# Altium integrated library Twomes_Monitor_master.IntLib: 18 symbols
Pins are listed as number, name and electrical type; pins without a type are passive.

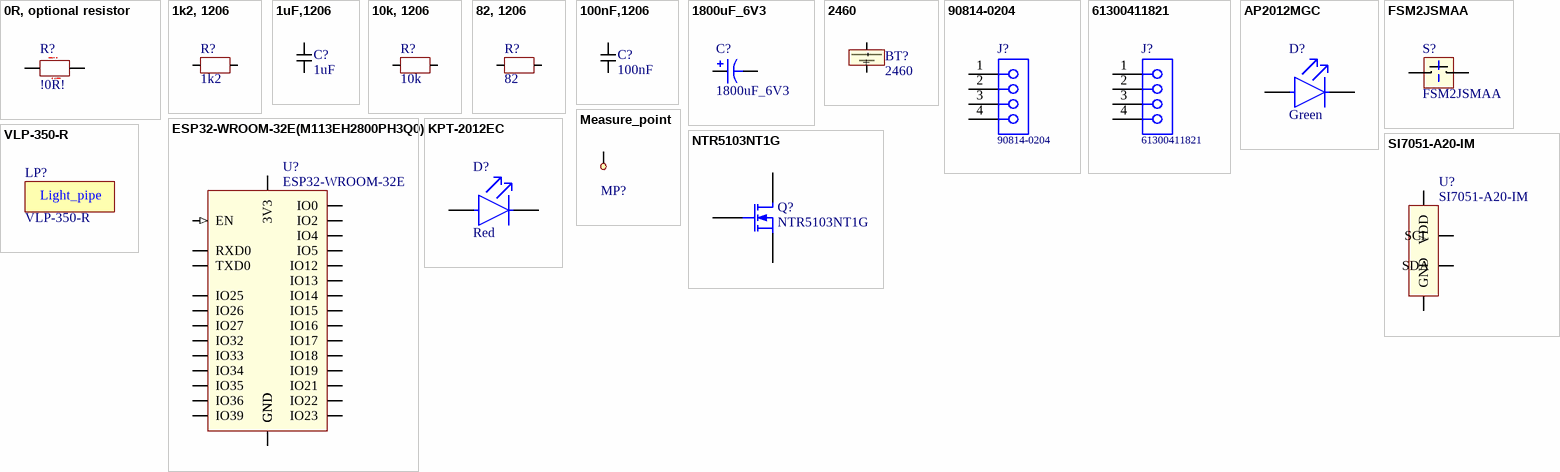
[diagram p0: symbols 0R, optional resistor to VLP-350-R]

## 0R, optional resistor
designator R?, comment !0R!  (no BOM)
normally shorted, but easy to change to an resistor footprint
footprint R1206_Simple-Assemble_shorted (Chip Resistor, 2-Leads, Body 3,10x1,60mm, IPC High Density)
footprint R1206_Simple-Assemble (Chip Resistor, 2-Leads, Body 3,10x1,60mm, IPC High Density)
pins: 1, 2
text: !

## 1k2, 1206
designator R?, comment 1k2
SMD Chip Resistor, 1206 [3216 Metric], 1 kohm, MCSR 12 Series, 200 V, Ceramic, 250 mW; Brand: MULTICOMP; Order Code: 2446791; Power: 250mW; Resistance: 1k2; Type: MCWR12X1201FTL; Supplier: Farnell; Price: 0,0298
footprint R1206_Simple-Assemble (Chip Resistor, 2-Leads, Body 3,10x1,60mm, IPC High Density)
footprint R1206 (Chip Resistor, 2-Leads, Body 3,10x1,57mm, IPC Medium Density)
pins: 1, 2

## 1uF,1206
designator C?, comment 1uF
1uF, 1206; Capacitance: 1uF; Brand: *; Order Code: *; Type: *
footprint C1206 (Chip Capacitor, 2-Leads, Body 3,20x1,60mm, IPC Medium Density)
pins: 1, 2

## 10k, 1206
designator R?, comment 10k
10k, 1206, 250mW, 200V; Brand: TE CONNECTIVITY; Order Code: 2861956; Resistance: 10k; Power: 250mW; Type: CRGCQ1206J10K; Supplier: Farnell; Price: 0,0139
footprint R1206_Simple-Assemble (Chip Resistor, 2-Leads, Body 3,10x1,60mm, IPC High Density)
footprint R1206 (Chip Resistor, 2-Leads, Body 3,10x1,57mm, IPC Medium Density)
pins: 1, 2

## 82, 1206
designator R?, comment 82
Brand: MULTICOMP; Resistance: 82; Supplier: Farnell
footprint R1206_Simple-Assemble (Chip Resistor, 2-Leads, Body 3,10x1,60mm, IPC High Density)
footprint R1206 (Chip Resistor, 2-Leads, Body 3,10x1,57mm, IPC Medium Density)
pins: 1, 2

## 100nF,1206
designator C?, comment 100nF
100nF, 1206; Capacitance: 100nF; Brand: *; Order Code: *; Type: *
footprint C1206 (Chip Capacitor, 2-Leads, Body 3,20x1,60mm, IPC Medium Density)
pins: 1, 2

## 1800uF_6V3
designator C?
SMD Aluminium Electrolytic Capacitor, Radial Can, 1800 µF, 10 V, 0.092 ohm, TRV Series; Manufacturer Part Number: EEE-FN0J182UV; Manufacturer: Panasonic; Capacitance: 1.8mF; Voltage Rating: 10V; Value: 1800uF; Supplier Unit Price 1: €0.98708; Supplier Part Number 1: 667-EEE-FN0J182UV; Supplier 1: Mouser; Mount: Surface Mount; Category: Aluminum Electrolytic Capacitors
footprint CAPAE109103X105M
pins: 1, 2

## 2460
designator BT?
Battery Holder, AA x 1, Through Hole; Brand: KEYSTONE; Farnell_Price: 1,80; Type: 2460; Farnell_Order_Code: 1702629; Mouser_Price: 1,10; Mouser_Order_Code: 534-2460
footprint KEYSTONE_2410 (Battery holder, AA)
pins: 1 +, 2 -

## 90814-0204
designator J?
Pin Header, Signal, 1.27 mm, 1 Rows, 4 Contacts, Surface Mount Straight, Picoflex 90814 Series; Manufacturer: MOLEX; Manufacturer Part Number: 90814-0204
footprint MOLEX_90814-0204
pins: 1, 2, 3, 4

## 61300411821
designator J?
THT Vertical Socket Header WR-PHD, Pitch 2.54 mm, Single Row, 4 pins; Pin Number: 4; Pitch: 2.54 mm; Gender: Female; Rated Current: 3 A; Working Voltage: 250 VAC; Withstanding Voltage: 500 VAC; Contact Resistance: 20 mOhm; ComponentLink1Description: Manufacturer; ComponentLink1URL: http://www.we-online.de; ComponentLink2Description: Datasheet; ComponentLink2URL: https://katalog.we-online.de/em/datasheet/6130xx11821.pdf; Part Number: 61300411821; Published Date: August 2018; Publisher: Wurth Elektronik; Operating Temperature: -40 to 125 degC; Mounting Technology: THT; Packaging: Tray; Row Number: Single; Orientation: Vertical
footprint 61300411821 (Socket Header, Pitch 2.54 mm, THT, Vertical, single row, 4p)
pins: 1, 2, 3, 4

## AP2012MGC
designator D?, comment Green
Standard LEDs - SMD GRN WATER CLEAR 0805; Manufacturer: Kingbright; Manufacturer Part Number: AP2012MGC; Forward Current: 20mA; Forward Voltage: 2.1V; Case/Package: 0805; Category: LEDs; Color: Green; Supplier 1: Mouser; Supplier Part Number 1: 604-AP2012MGC
footprint Kingbright_KPT-2012EC_0
pins: 1 C, 2 A

## ESP32-WROOM-32E(M113EH2800PH3Q0)
designator U?, comment ESP32-WROOM-32E
USB-modules (802.11) SMD Module ESP32-WROOM-32E, ESP32-D0WD-V3, 16 MB SPI flash, PCB antenna; Brand: Espressif Systems; Order Code: 356-ESP32WRM32E128PH; Type: ESP32-WROOM-32E; Price: 2,64; Supplier: MOUSER
footprint ESP32­WROOM­32E
pins: 1 GND (power) "Ground", 2 3V3 (power) "Power supply", 3 EN (in) "HIGH: on, LOW: off", 4 IO36 (io) "GPIO36, ADC1_CH0, RTC_GPIO0", 5 IO39 (io) "GPIO39, ADC1_CH3, RTC_GPIO3", 6 IO34 (io) "GPIO34, ADC1_CH6, RTC_GPIO4", 7 IO35 (io) "GPIO35, ADC1_CH7, RTC_GPIO5", 8 IO32 (io) "GPIO32, XTAL_32K_P (32.768 kHz crystal oscillator input), ADC1_CH4,  TOUCH9, RTC_GPIO9", 9 IO33 (io) "GPIO33, XTAL_32K_N (32.768 kHz crystal oscillator output),  ADC1_CH5, TOUCH8, RTC_GPIO8", 10 IO25 (io) "GPIO25, DAC_1, ADC2_CH8, RTC_GPIO6, EMAC_RXD0", 11 IO26 (io) "GPIO26, DAC_2, ADC2_CH9, RTC_GPIO7, EMAC_RXD1", 12 IO27 (io) "GPIO27, ADC2_CH7, TOUCH7, RTC_GPIO17, EMAC_RX_DV", 13 IO14 (io) "GPIO14, ADC2_CH6, TOUCH6, RTC_GPIO16, MTMS, HSPICLK,  HS2_CLK, SD_CLK, EMAC_TXD2", 14 IO12 (io) "GPIO12, ADC2_CH5, TOUCH5, RTC_GPIO15, MTDI, HSPIQ,  HS2_DATA2, SD_DATA2, EMAC_TXD3", 15 GND (power) "Ground", 16 IO13 (io) "GPIO13, ADC2_CH4, TOUCH4, RTC_GPIO14, MTCK, HSPID,  HS2_DATA3, SD_DATA3, EMAC_RX_ER", 17 NC (hiz), 18 NC (hiz), 19 NC (hiz), 20 NC (hiz), 21 NC (hiz), 22 NC (hiz), 23 IO15 (io) "GPIO15, ADC2_CH3, TOUCH3, MTDO, HSPICS0, RTC_GPIO13,  HS2_CMD, SD_CMD, EMAC_RXD3", 24 IO2 (io) "GPIO2, ADC2_CH2, TOUCH2, RTC_GPIO12, HSPIWP, HS2_DATA0,  SD_DATA0", 25 IO0 (io) "GPIO0, ADC2_CH1, TOUCH1, RTC_GPIO11, CLK_OUT1,  EMAC_TX_CLK", 26 IO4 (io) "GPIO4, ADC2_CH0, TOUCH0, RTC_GPIO10, HSPIHD, HS2_DATA1,  SD_DATA1, EMAC_TX_ER", 27 IO16 (io) "GPIO16, HS1_DATA4, U2RXD, EMAC_CLK_OUT", 28 IO17 (io) "GPIO17, HS1_DATA5, U2TXD, EMAC_CLK_OUT_180", 29 IO5 (io) "GPIO5, VSPICS0, HS1_DATA6, EMAC_RX_CLK", 30 IO18 (io) "GPIO18, VSPICLK, HS1_DATA7", 31 IO19 (io) "GPIO19, VSPIQ, U0CTS, EMAC_TXD0", 32 NC (hiz), 33 IO21 (io) "GPIO21, VSPIHD, EMAC_TX_EN", 34 RXD0 (io) "GPIO3, U0RXD, CLK_OUT2", 35 TXD0 (io) "GPIO1, U0TXD, CLK_OUT3, EMAC_RXD2", 36 IO22 (io) "GPIO22, VSPIWP, U0RTS, EMAC_TXD1", 37 IO23 (io) "GPIO23, VSPID, HS1_STROBE", 38 GND (power)

## FSM2JSMAA
designator S?
Tactile Switch, FSMJSM Series, Top Actuated, Surface Mount, Round Button, 260 gf, 50mA at 24VDC; Manufacturer: TE Connectivity; Connector Type: SMD/SMT; Voltage Rating (DC): 24V; Supplier Unit Price 1: €0.13022; Mount: Surface Mount; Manufacturer Part Number: FSM2JSMAA; Category: Pushbutton Switches; Case/Package: SMD/SMT
footprint FP-FSM2JSMAA-MFG
pins: 1 a, 2 b, 3 c "connected to a", 4 d "connected to b"

## KPT-2012EC
designator D?, comment Red
KPT-2012EC -  LED, Low Power, Red, SMD, 0805 [2012 Metric], 30 mA, 2 V, 617 nm; Brand: KINGBRIGHT; Order Code: 2099236; Type: KPT-2012EC; Supplier: Farnell; Price: 0,112
footprint Kingbright_KPT-2012EC_0
pins: 1 C, 2 A

## Measure_point
designator MP?  (value not drawn)  (no BOM)
Measurepoint
footprint MeasurePoint_1.5mm
pins: 1

## NTR5103NT1G
designator Q?
Power MOSFET, N Channel, 60 V, 260 mA, 1 ohm, SOT-23, Surface Mount; Manufacturer: ON Semiconductor; Manufacturer Part Number: NTR5103NT1G
footprint SOT23 (SOT23, 3-Leads, Body 2,92x2,37mm, Pitch 0,95mm, IPC High Density)
pins: 1 G, 2 S, 3 D

## SI7051-A20-IM
designator U?
Temperature Sensor IC, Digital, ± 0.1°C, -40 °C, 125 °C, DFN, 6 Pins; Brand: SILICON LABS; Order Code: 2769160; Type: SI7051-A20-IM; Price: 1,98; Supplier: Farnell; ClassName: Smallpitch
footprint 3x3 6-pin DFN (SON, 6-Leads, Body 3,00x3,00mm, Pitch 1,00mm, Thermal Pad 2,40x1,50mm, IPC Medium Density)
pins: 1 SDA (io) "I2C data line", 2 GND (power) "Supply voltage low", 5 VDD (power) "Supply voltage high", 6 SCL (io) "I2C clock"

## VLP-350-R
designator LP?
LIGHT PIPE, SINGLE, ROUND, PCB; Manufacturer: BIVAR; Manufacturer Part Number: VLP-350-R
footprint VLP-350-R
text: Light_pipe